# Altium footprint library UWRT_Footprint_Library_2020.PcbLib: 376 footprints (part 22 of 24)
Each footprint in its own frame and in the unit in brackets; x right, y up, seen from the top. Pads: shape width x height; smd on the part's side, far side on the other; paste and mask are expansions set on the pad; w line width, h text height; cw(c..) or ccw(c..) is an arc to the next point about the centre after c.
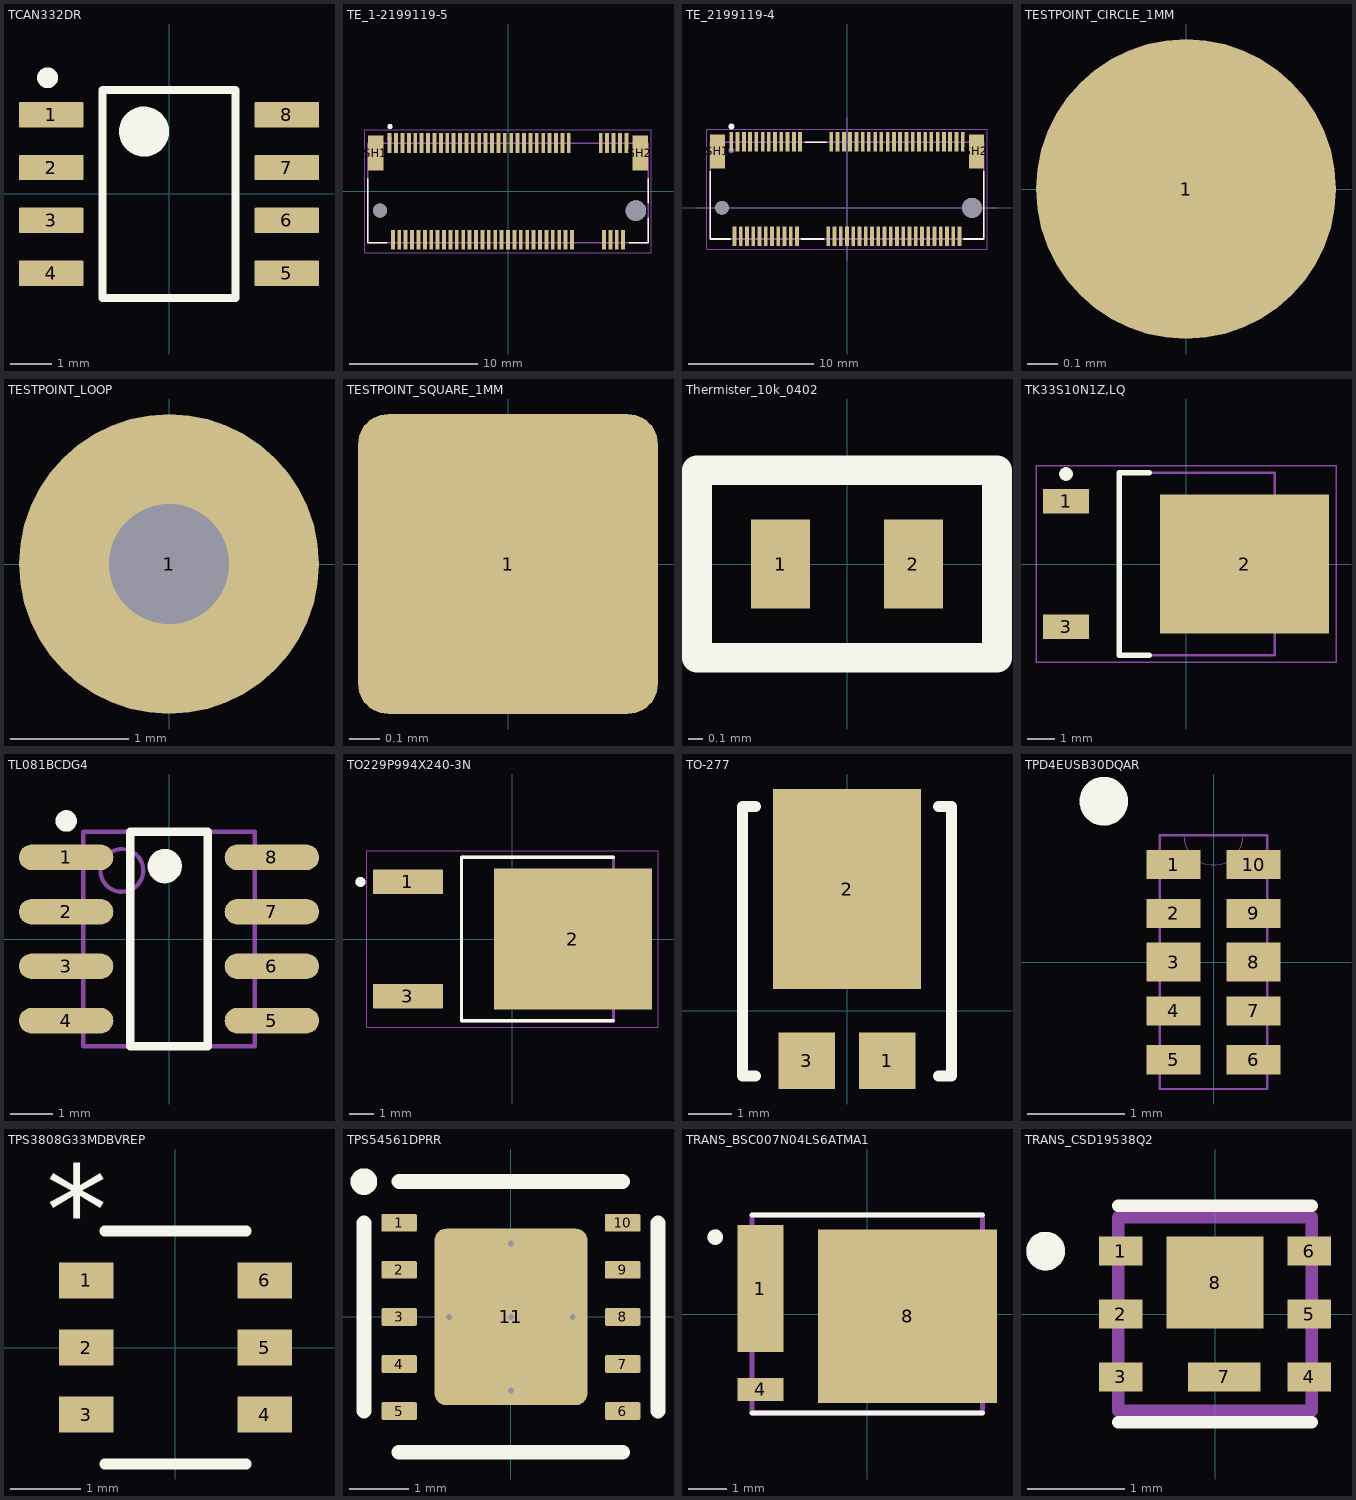
[diagram p21: the footprints below, top view; thin cyan lines are the x and y axes]

## TCAN332DR [mil] "SOIC, 8 Leads, Body 5x4mm, Pitch 1.27mm"
height 68.9
pads (8):
  rrect8% 61x24 smd: 1(-111.5,75) 2(-111.5,25) 3(-111.5,-25) 4(-111.5,-75) 5(111.5,-75) 6(111.5,-25) 7(111.5,25) 8(111.5,75)
Top Overlay:
  circle w23.62: c-23.62,59.06 r11.81
  circle w9.84: c-115,110 r4.92
  lines w7.87: -62.99,-98.43 62.99,-98.43 62.99,98.43 -62.99,98.43 -62.99,-98.43
3D body "TCAN332DR.stp": height 68.9, standoff 0, extent -118.1,-96.45 118.12,96.46

## TE_1-2199119-5 [mm]
pads (71):
  rect 0.3x1.55 smd: 1(-9.25,3.775) 2(-9,-3.775) 3(-8.75,3.775) 4(-8.5,-3.775) 5(-8.25,3.775) 6(-8,-3.775) 7(-7.75,3.775) 8(-7.5,-3.775) 9(-7.25,3.775) 10(-7,-3.775) 11(-6.75,3.775) 12(-6.5,-3.775) 13(-6.25,3.775) 14(-6,-3.775) 15(-5.75,3.775) 16(-5.5,-3.775) 17(-5.25,3.775) 18(-5,-3.775) 19(-4.75,3.775) 20(-4.5,-3.775) 21(-4.25,3.775) 22(-4,-3.775) 23(-3.75,3.775) 24(-3.5,-3.775) 25(-3.25,3.775) 26(-3,-3.775) 27(-2.75,3.775) 28(-2.5,-3.775) 29(-2.25,3.775) 30(-2,-3.775) 31(-1.75,3.775) 32(-1.5,-3.775) 33(-1.25,3.775) 34(-1,-3.775) 35(-0.75,3.775) 36(-0.5,-3.775) 37(-0.25,3.775) 38(0,-3.775) 39(0.25,3.775) 40(0.5,-3.775) 41(0.75,3.775) 42(1,-3.775) 43(1.25,3.775) 44(1.5,-3.775) 45(1.75,3.775) 46(2,-3.775) 47(2.25,3.775) 48(2.5,-3.775) 49(2.75,3.775) 50(3,-3.775) 51(3.25,3.775) 52(3.5,-3.775) 53(3.75,3.775) 54(4,-3.775) 55(4.25,3.775) 56(4.5,-3.775) 57(4.75,3.775) 58(5,-3.775) 67(7.25,3.775) 68(7.5,-3.775) 69(7.75,3.775) 70(8,-3.775) 71(8.25,3.775) 72(8.5,-3.775) 73(8.75,3.775) 74(9,-3.775) 75(9.25,3.775)
  rect 1.2x2.75 smd: SH1(-10.35,3) SH2(10.35,3)
  round 1.1 hole 1.1 unplated: ""(-10,-1.5)
  round 1.6 hole 1.6 unplated: ""(10,-1.5)
Top Overlay:
  circle w0.2: c-9.225,5.075 r0.1
  lines w0.127: -10.95,1 -10.95,-4 -9.5,-4 ; 9.5,-4 10.95,-4 10.95,-2.1 ; 10.95,-0.9 10.95,1
Mechanical 13:
  circle w0.2: c-9.25,4.115 r0.1
  lines w0.127: -10.95,-4 10.95,-4 10.95,3.75 -10.95,3.75 -10.95,-4
Mechanical 15:
  lines w0.05: -11.2,-4.8 11.2,-4.8 11.2,4.8 -11.2,4.8 -11.2,-4.8

## TE_2199119-4 [mm]
pads (71):
  rect 0.3x1.55 smd: 1(-9.25,5.275) 2(-9,-2.275) 3(-8.75,5.275) 4(-8.5,-2.275) 5(-8.25,5.275) 6(-8,-2.275) 7(-7.75,5.275) 8(-7.5,-2.275) 9(-7.25,5.275) 10(-7,-2.275) 11(-6.75,5.275) 12(-6.5,-2.275) 13(-6.25,5.275) 14(-6,-2.275) 15(-5.75,5.275) 16(-5.5,-2.275) 17(-5.25,5.275) 18(-5,-2.275) 19(-4.75,5.275) 20(-4.5,-2.275) 21(-4.25,5.275) 22(-4,-2.275) 23(-3.75,5.275) 32(-1.5,-2.275) 33(-1.25,5.275) 34(-1,-2.275) 35(-0.75,5.275) 36(-0.5,-2.275) 37(-0.25,5.275) 38(0,-2.275) 39(0.25,5.275) 40(0.5,-2.275) 41(0.75,5.275) 42(1,-2.275) 43(1.25,5.275) 44(1.5,-2.275) 45(1.75,5.275) 46(2,-2.275) 47(2.25,5.275) 48(2.5,-2.275) 49(2.75,5.275) 50(3,-2.275) 51(3.25,5.275) 52(3.5,-2.275) 53(3.75,5.275) 54(4,-2.275) 55(4.25,5.275) 56(4.5,-2.275) 57(4.75,5.275) 58(5,-2.275) 59(5.25,5.275) 60(5.5,-2.275) 61(5.75,5.275) 62(6,-2.275) 63(6.25,5.275) 64(6.5,-2.275) 65(6.75,5.275) 66(7,-2.275) 67(7.25,5.275) 68(7.5,-2.275) 69(7.75,5.275) 70(8,-2.275) 71(8.25,5.275) 72(8.5,-2.275) 73(8.75,5.275) 74(9,-2.275) 75(9.25,5.275)
  rect 1.2x2.75 smd: SH1(-10.35,4.5) SH2(10.35,4.5)
  round 1.1 hole 1.1 unplated: ""(-10,0)
  round 1.6 hole 1.6 unplated: ""(10,0)
Top Overlay:
  circle w0.24: c-9.25,6.5 r0.12
  lines w0.127: -10.95,2.9 -10.95,-2.5 -9.35,-2.5 ; -3.65,-2.5 -1.85,-2.5 ; -3.35,5.25 -1.65,5.25 ; 9.35,-2.5 10.95,-2.5 10.95,2.9
Mechanical 13:
  circle w0.24: c-9.25,4.595 r0.12
  lines w0.05: -12,0 12,0 ; 0,-4.25 0,7.25
  lines w0.127: -10.95,-2.5 10.95,-2.5 10.95,5.25 -10.95,5.25 -10.95,-2.5
Mechanical 15:
  lines w0.05: -11.2,-3.3 11.2,-3.3 11.2,6.3 -11.2,6.3 -11.2,-3.3

## TESTPOINT_CIRCLE_1MM [mm]
pads (1):
  round 1 smd: 1(0,0)

## TESTPOINT_LOOP [mm]
pads (1):
  round 2.54 hole 1.02: 1(0,0)
3D body "User Library-Test Point Keystone - 5002 WHITE.STEP": height 4.57, standoff -3.05, extent -1.27,-1.27 1.27,1.27

## TESTPOINT_SQUARE_1MM [mm]
pads (1):
  rrect20% 1x1 smd: 1(0,0)

## Thermister_10k_0402 [mm]
pads (2):
  rect 0.4x0.6 smd: 1(-0.45,0) 2(0.45,0)
Top Overlay:
  lines w0.2: -1.016,-0.635 1.016,-0.635 1.016,0.635 -1.016,0.635 -1.016,-0.635
3D body "User Library-d0402h025.step": height 0.25, standoff 0, extent -0.5,-0.25 0.5,0.25

## TK33S10N1Z,LQ [mm] "D-PAK, 3-Pads, Body 5.95x6.71mm (max), IPC Medium Density"
height 2.5
pads (3):
  rect 1.7x0.9 smd: 1(-4.4,2.3) 3(-4.4,-2.3)
  rect 6.2x5.1 smd: 2(2.15,0)
Top Overlay:
  circle w0.25: c-4.4,3.3 r0.125
  lines w0.2: -1.35,-3.35 -2.45,-3.35 -2.45,3.35 -1.35,3.35
Mechanical 13:
  lines w0.1: -2.45,-3.35 -2.45,3.35 3.25,3.35 3.25,-3.35 -2.45,-3.35
Mechanical 15:
  lines w0.05: -5.5,-3.6 -5.5,3.6 5.5,3.6 5.5,-3.6 -5.5,-3.6
  lines w0.1: -0.5,0 0.5,0 ; 0,-0.5 0,0.5
3D body "TK33S10N1Z,LQ.step": height 2.5, standoff 0, extent -4.6,-3.35 4.9,3.35

## TL081BCDG4 [mm] "IC OPAMP JFET 1 CIRCUIT 8SOIC"
pads (8):
  oval 2.2x0.6 smd: 1(-2.4,1.905) 2(-2.4,0.635) 3(-2.4,-0.635) 4(-2.4,-1.905) 5(2.4,-1.905) 6(2.4,-0.635) 7(2.4,0.635) 8(2.4,1.905)
Top Overlay:
  circle w0.4: c-0.1,1.7 r0.2
  circle w0.25: c-2.4,2.755 r0.125
  lines w0.2: -0.9,-2.5 0.9,-2.5 0.9,2.5 -0.9,2.5 -0.9,-2.5
Mechanical 13:
  circle w0.1: c-1.1,1.6 r0.5
  lines w0.1: -2,-2.5 2,-2.5 2,2.5 -2,2.5 -2,-2.5
3D body: height 1.75, standoff 0.1, extent -2,-2.5 2,2.5

## TO229P994X240-3N [mm]
pads (3):
  rect 2.81x0.98 smd: 1(-4.19,2.29) 3(-4.19,-2.29)
  rect 6.33x5.67 smd: 2(2.43,0)
Top Overlay:
  circle w0.2: c-6.095,2.29 r0.1
  lines w0.127: 4.055,-3.283 -2.045,-3.283 -2.045,3.283 4.055,3.283
Top Paste:
  region: 3.775,-1.235 5.305,-1.235 5.305,-2.545 3.775,-2.545
  region: 1.665,-1.235 3.195,-1.235 3.195,-2.545 1.665,-2.545
  region: -0.445,-1.235 1.085,-1.235 1.085,-2.545 -0.445,-2.545
  region: 3.775,2.545 5.305,2.545 5.305,1.235 3.775,1.235
  region: 1.665,2.545 3.195,2.545 3.195,1.235 1.665,1.235
  region: -0.445,2.545 1.085,2.545 1.085,1.235 -0.445,1.235
  region: 3.775,0.655 5.305,0.655 5.305,-0.655 3.775,-0.655
  region: -0.445,0.655 1.085,0.655 1.085,-0.655 -0.445,-0.655
  region: 1.665,0.655 3.195,0.655 3.195,-0.655 1.665,-0.655
Mechanical 4:
  circle w0.2: c-6.095,2.29 r0.1
  circle w0.2: c-6.095,2.29 r0.1
  lines w0.127: -2.045,-3.283 -2.045,3.283 ; -2.045,-3.283 4.055,-3.283 ; -2.045,-3.283 -2.045,3.283 ; -2.045,-3.283 4.055,-3.283 ; -2.045,3.283 4.055,3.283 ; -2.045,3.283 4.055,3.283 ; 4.055,-3.283 4.055,3.283 ; 4.055,-3.283 4.055,3.283
Mechanical 16:
  lines w0.05: -5.845,-3.532 5.845,-3.532 5.845,3.532 -5.845,3.532 -5.845,-3.532
3D body "CircuitWorks-TO-252.STEP": height 2.3, standoff 0, extent -4.748,-3.303 4.952,3.277

## TO-277 [mm]
pads (3):
  rect 1.3x1.3 smd: 1(0.93,-1.15) 3(-0.93,-1.15)
  rect 3.4x4.6 smd: 2(0,2.8)
Top Overlay:
  lines w0.254: -2.1,-1.5 -2.4,-1.5 -2.4,4.7 -2.1,4.7 ; 2.1,-1.5 2.4,-1.5 2.4,4.7 2.1,4.7
3D body "User Library-User Library-TO-277.STEP": height 1.2, standoff 0, extent -2.1,-1.549 2.1,4.901

## TPD4EUSB30DQAR [mm] "USON-10"
height 0.55
pads (10):
  rect 0.55x0.3 smd paste-0.15 mask+0.05: 1(-0.41,1) 2(-0.41,0.5) 4(-0.41,-0.5) 5(-0.41,-1) 6(0.41,-1) 7(0.41,-0.5) 9(0.41,0.5) 10(0.41,1)
  rect 0.55x0.4 smd paste+0 mask+0.05: 3(-0.41,0) 8(0.41,0)
Top Overlay:
  circle w0.25: c-1.125,1.65 r0.125
Mechanical 13:
  lines w0: -0.305,1.3 ccw(c0,1.3) 0.305,1.3
  lines w0.025: -0.55,-1.3 0.55,-1.3 0.55,1.3 -0.55,1.3 -0.55,-1.3
3D body: height 0.25, standoff 0, extent 0,0 0.254,0.254
3D body "DQA10.step": height 0.55, standoff 0, extent -0.55,-1.3 0.55,1.3

## TPS3808G33MDBVREP [mil]
pads (6):
  rect 30.5x20 smd paste+0 mask+0: 1(-49.75,37.4) 2(-49.75,0) 3(-49.75,-37.4) 4(49.75,-37.4) 5(49.75,0) 6(49.75,37.4)
Top Overlay:
  lines w6: -39.5,-65 39.5,-65 ; -39.5,65 39.5,65
  text "*" at -72.25,52.4 h50
3D body "DBV6.step": height 57.09, standoff 0, extent -59.01,-59.99 59.02,60.01

## TPS54561DPRR [mm] "Buck Converter"
pads (11):
  rrect15% 0.6x0.3 smd: 1(-1.9,1.6) 2(-1.9,0.8) 3(-1.9,0) 4(-1.9,-0.8) 5(-1.9,-1.6) 6(1.9,-1.6) 7(1.9,-0.8) 8(1.9,0) 9(1.9,0.8) 10(1.9,1.6)
  rrect15% 2.6x3 smd: 11(0,0)
via 0,0 diameter 0.2 hole 0.1
via 0,1.25 diameter 0.2 hole 0.1
via 0,-1.25 diameter 0.2 hole 0.1
via 1.05,0 diameter 0.2 hole 0.1
via -1.05,0 diameter 0.2 hole 0.1
Top Overlay:
  circle w0.254: c-2.5,2.3 r0.1
  lines w0.254: -2.5,-1.6 -2.5,1.6 ; -1.9,-2.3 1.9,-2.3 ; -1.9,2.3 1.9,2.3 ; 2.5,-1.6 2.5,1.6
3D body "TPS54561DPRR.STEP": height 0.8, standoff 0, extent -2,-2 2,2

## TRANS_BSC007N04LS6ATMA1 [mm]
pads (3):
  rect 1.2x3.3 smd paste-3 mask+0: 1(-2.775,0.66)
  rect 1.2x0.6 smd paste-2 mask+0: 4(-2.775,-1.96)
  rect 4.65x4.51 smd paste-3 mask+0: 8(1.05,-0.055)
Top Overlay:
  circle w0.2: c-3.95,2 r0.1
  lines w0.127: -3,-2.575 3,-2.575 ; -3,2.575 3,2.575
Top Paste:
  region: -2.27,-2.163 -2.72,-2.163 -2.72,-1.76 -2.27,-1.76
  region: -2.92,-2.167 -3.27,-2.167 -3.27,-1.76 -2.92,-1.76
  region: -2.92,1.657 -3.27,1.657 -3.27,2.05 -2.92,2.05
  region: -2.92,0.381 -3.27,0.381 -3.27,0.78 -2.92,0.78
  region: -2.92,-0.893 -3.27,-0.893 -3.27,-0.49 -2.92,-0.49
  region: -2.27,-0.891 -2.72,-0.891 -2.72,0.01 -2.27,0.01
  region: -2.27,1.316 -2.72,1.316 -2.72,2.21 -2.27,2.21
  region: -2.27,0.211 -2.72,0.211 -2.72,1.11 -2.27,1.11
  region: 0.55,0.045 -0.95,0.045 -0.95,1.545 0.55,1.545
  region: 2.25,0.045 0.75,0.045 0.75,1.545 2.25,1.545
  region: 0.55,-1.662 -0.95,-1.662 -0.95,-0.155 0.55,-0.155
  region: 2.25,-1.661 0.75,-1.661 0.75,-0.155 2.25,-0.155
  region: 3.28,1.602 2.53,1.602 2.53,2.1 3.28,2.1
  region: 3.28,0.331 2.53,0.331 2.53,0.83 3.28,0.83
  region: 3.28,-0.943 2.53,-0.943 2.53,-0.44 3.28,-0.44
  region: 3.28,-2.212 2.53,-2.212 2.53,-1.71 3.28,-1.71
Top Solder:
  region: 3.325,1.55 2.525,1.55 2.525,0.88 3.325,0.88 3.325,0.28 2.525,0.28 2.525,-0.39 3.325,-0.39 3.325,-0.99 2.525,-0.99 2.525,-1.66 3.325,-1.66 3.325,-2.26 -1.225,-2.26 -1.225,2.15 3.325,2.15
  region: -2.225,-2.21 -3.325,-2.21 -3.325,-1.71 -2.225,-1.71
  region: -2.225,-0.94 -3.325,-0.94 -3.325,-0.44 -2.825,-0.44 -2.825,0.33 -3.325,0.33 -3.325,0.83 -2.825,0.83 -2.825,1.6 -3.325,1.6 -3.325,2.1 -2.825,2.1 -2.825,2.26 -2.225,2.26
Mechanical 13:
  circle w0.2: c-3.95,2 r0.1
  lines w0.127: -3,-2.575 -3,2.575 3,2.575 3,-2.575 -3,-2.575
3D body "User Library-FDMS8018.STEP": height 1.1, standoff 0, extent -2.972,-2.651 3.278,2.549

## TRANS_CSD19538Q2 [mm]
pads (8):
  rect 0.45x0.3 smd mask+0: 1(-0.975,0.65) 2(-0.975,0) 3(-0.975,-0.65) 4(0.975,-0.65) 5(0.975,0) 6(0.975,0.65)
  rect 0.75x0.3 smd paste-1 mask+0: 7(0.095,-0.65)
  rect 1x0.95 smd paste-1 mask+0: 8(0,0.325)
Top Overlay:
  circle w0.2: c-1.75,0.65 r0.1
  lines w0.127: -1,-1.12 1,-1.12 ; -1,1.12 1,1.12
Top Paste:
  region: 0.445,-0.795 -0.255,-0.795 -0.255,-0.505 0.445,-0.505
  region: 0.45,-0.105 -0.45,-0.105 -0.45,0.755 0.45,0.755
Top Solder:
  region: 0.52,-0.85 -0.33,-0.85 -0.33,-0.45 0.52,-0.45
  region: 1.25,0.45 0.7,0.45 0.7,0.85 1.25,0.85
  region: 1.25,-0.2 0.7,-0.2 0.7,0.2 1.25,0.2
  region: 1.25,-0.85 0.7,-0.85 0.7,-0.45 1.25,-0.45
  region: -0.7,-0.85 -1.25,-0.85 -1.25,-0.45 -0.7,-0.45
  region: -0.7,-0.2 -1.25,-0.2 -1.25,0.2 -0.7,0.2
  region: -0.7,0.45 -1.25,0.45 -1.25,0.85 -0.7,0.85
  region: 0.55,-0.2 -0.55,-0.2 -0.55,0.85 0.55,0.85
Mechanical 13:
  circle w0.2: c-1.75,0.65 r0.1
  lines w0.127: -1,-1 1,-1 1,1 -1,1 -1,-1
3D body "CSD19538Q2.STEP": height 0.8, standoff 0, extent -1,-1 1,1